# Altium footprint library Cyberdeck.PcbLib: 261 footprints (part 1 of 17)
Each footprint in its own frame and in the unit in brackets; x right, y up, seen from the top. Pads: shape width x height; smd on the part's side, far side on the other; paste and mask are expansions set on the pad; w line width, h text height; cw(c..) or ccw(c..) is an arc to the next point about the centre after c.
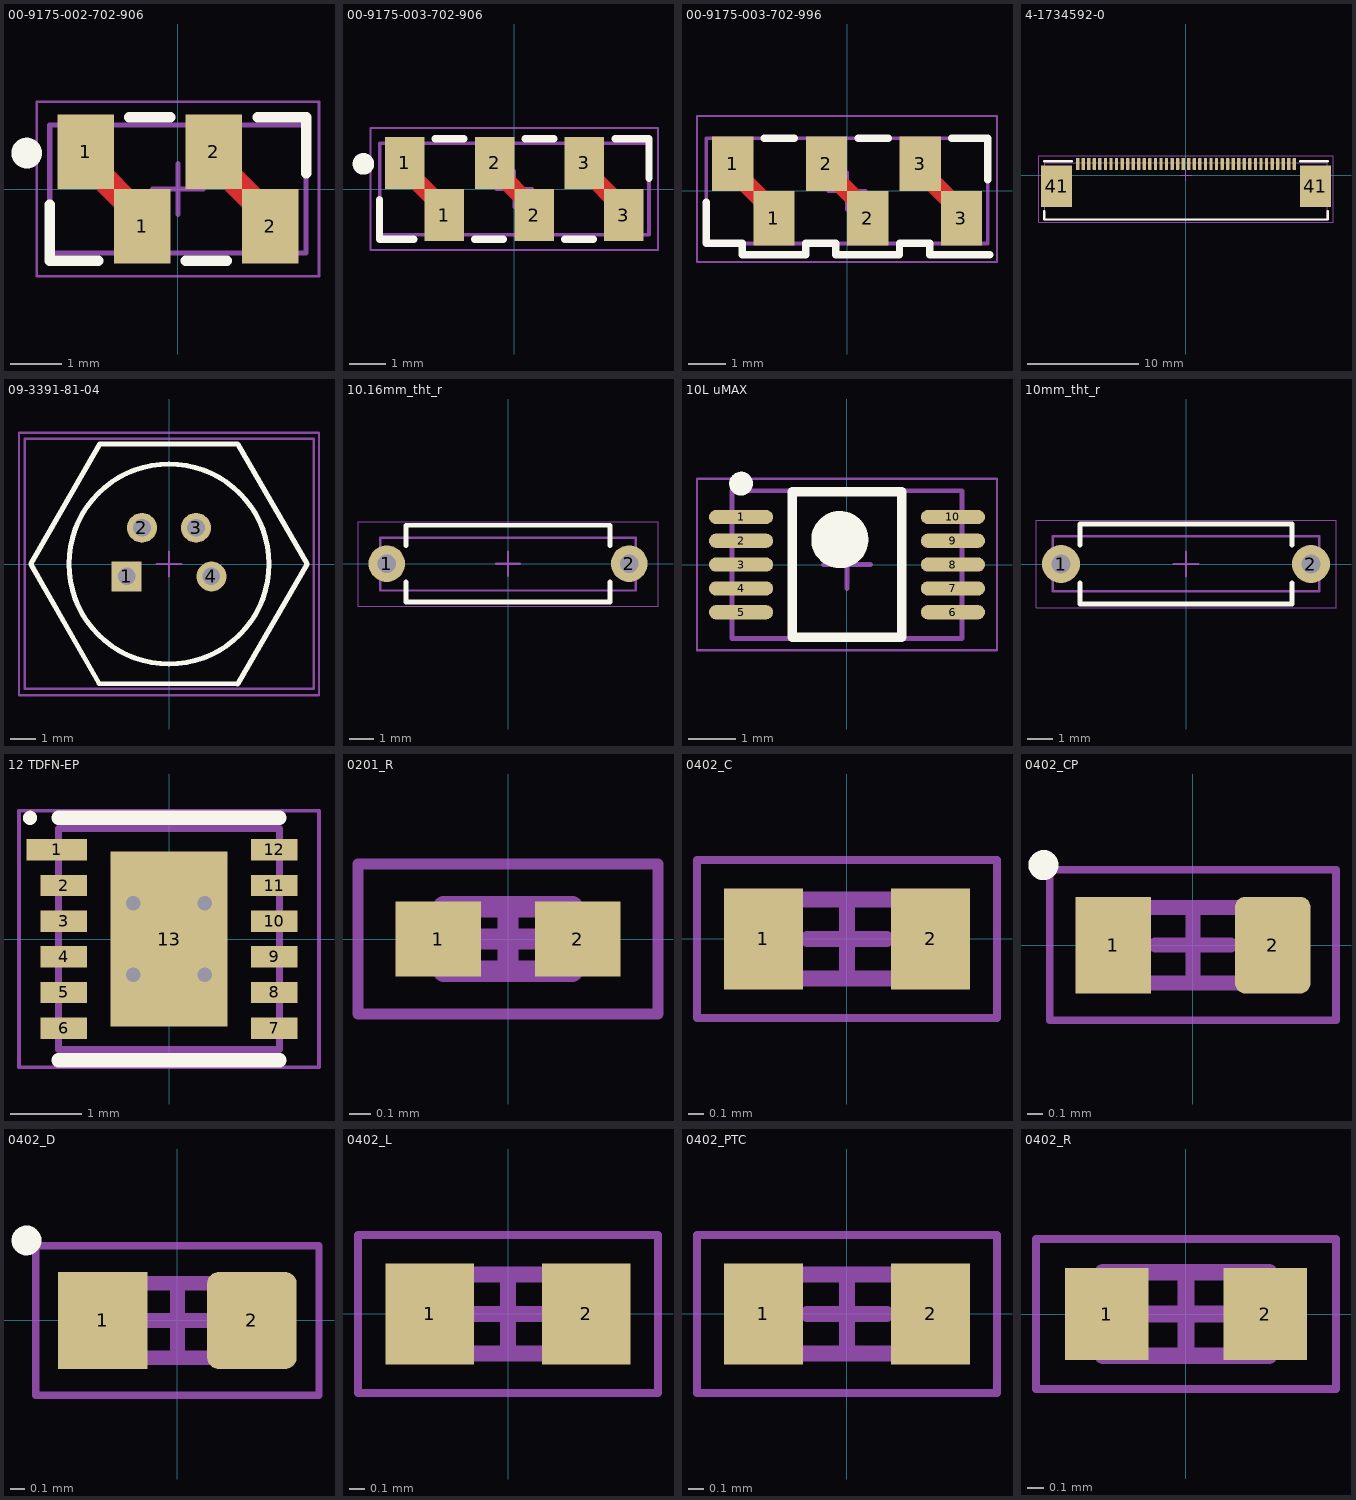
[diagram p0: the footprints below, top view; thin cyan lines are the x and y axes]

## 00-9175-002-702-906 [mm] "00-9175-002-702-906"
height 3.8
pads (4):
  rect 1.1x1.45 smd: 1(-1.8,0.725) 1(-0.7,-0.725) 2(0.7,0.725) 2(1.8,-0.725)
Top Layer:
  lines w0.5: -1.8,0.725 -1.8,0.55 -0.7,-0.55 -0.7,-0.725 ; 0.7,0.725 0.7,0.55 1.8,-0.55 1.8,-0.725
Top Overlay:
  circle w0.3: c-2.95,0.7 r0.15
  lines w0.2: -2.5,-0.3 -2.5,-1.4 -1.55,-1.4 ; -0.95,1.4 -0.15,1.4 ; 0.15,-1.4 0.95,-1.4 ; 1.55,1.4 2.5,1.4 2.5,0.3
Top Solder:
  lines w0.7: -1.887,0.638 -0.613,-0.637 ; 0.613,0.638 1.887,-0.637
Assembly Top:
  lines w0.1: -2.5,-1.25 -2.5,1.25 2.495,1.25 2.495,-1.25 -2.5,-1.25
Courtyard Top:
  lines w0.05: -2.75,-1.7 -2.75,1.7 2.75,1.7 2.75,-1.7 -2.75,-1.7
  lines w0.1: -0.5,0 0.5,0 ; 0,-0.5 0,0.5
3D body "AVX Interconnect-00-9175-002-702-906.STEP": height 3.71, standoff 0.01, extent -2.5,-1.25 2.5,1.25

## 00-9175-003-702-906 [mm] "00-9175-003-702-906"
height 3.8
pads (6):
  rect 1.1x1.45 smd paste-0.05: 1(-3.05,0.725) 1(-1.95,-0.725) 2(-0.55,0.725) 2(0.55,-0.725) 3(1.95,0.725) 3(3.05,-0.725)
Top Layer:
  lines w0.5: -3.137,0.637 -1.863,-0.637 ; -0.637,0.637 0.637,-0.637 ; 1.863,0.637 3.137,-0.637
Top Overlay:
  circle w0.3: c-4.2,0.7 r0.15
  lines w0.2: -3.75,-0.3 -3.75,-1.4 -2.8,-1.4 ; -2.2,1.4 -1.4,1.4 ; -1.1,-1.4 -0.3,-1.4 ; 0.3,1.4 1.1,1.4 ; 1.4,-1.4 2.2,-1.4 ; 2.8,1.4 3.75,1.4 3.75,0.3
Top Solder:
  lines w0.7: -3.137,0.637 -1.863,-0.637 ; -0.637,0.637 0.637,-0.637 ; 1.863,0.637 3.137,-0.637
Assembly Top:
  lines w0.1: -3.75,-1.275 3.75,-1.275 3.75,1.275 -3.75,1.275 -3.75,-1.275
Courtyard Top:
  lines w0.05: -4,-1.7 -4,1.7 4,1.7 4,-1.7 -4,-1.7
  lines w0.1: -0.5,0 0.5,0 ; 0,-0.5 0,0.5
3D body "AVX Interconnect-00-9175-003-702-906.STEP": height 3.71, standoff 0.01, extent -3.75,-1.25 3.75,1.25

## 00-9175-003-702-996 [mm] "00-9175-003-702-996"
height 5.2
pads (6):
  rect 1.1x1.45 smd: 1(-3.05,0.725) 1(-1.95,-0.725) 2(-0.55,0.725) 2(0.55,-0.725) 3(1.95,0.725) 3(3.05,-0.725)
Top Layer:
  lines w0.5: -2.7,0.2 -2.3,-0.2 ; -0.2,0.2 0.2,-0.2 ; 2.3,0.2 2.7,-0.2
Top Overlay:
  lines w0.2: -3.75,-0.3 -3.75,-1.4 -2.8,-1.4 -2.8,-1.7 -1.1,-1.7 -1.1,-1.4 -0.3,-1.4 -0.3,-1.7 1.4,-1.7 1.4,-1.4 2.2,-1.4 2.2,-1.7 3.8,-1.7 ; -2.2,1.4 -1.4,1.4 ; 0.3,1.4 1.1,1.4 ; 2.8,1.4 3.75,1.4 3.75,0.3
Top Solder:
  lines w0.7: -3.137,0.637 -1.863,-0.637 ; -0.637,0.637 0.637,-0.637 ; 1.863,0.637 3.137,-0.637
Assembly Top:
  lines w0.1: -3.75,1.4 -3.75,1.4 ; -3.75,1.4 -3.75,-1.4 3.75,-1.4 3.75,1.4 -3.75,1.4
Courtyard Top:
  lines w0.05: -4,-1.9 4,-1.9 4,2 -4,2 -4,-1.9
  lines w0.1: -0.5,0 0.5,0 ; 0,-0.5 0,0.5
3D body "AVX Interconnect-00-9175-003-702-996.STEP": height 3.71, standoff 0.01, extent -3.75,-1.4 3.75,1.4

## 4-1734592-0 [mm] "4-1734592-0"
height 2.1
pads (42):
  rect 0.3x1.1 smd mask+0.051: 1(-9.75,1)
  rrect50% 0.3x1.1 smd mask+0.051: 2(-9.25,1) 3(-8.75,1) 4(-8.25,1) 5(-7.75,1) 6(-7.25,1) 7(-6.75,1) 8(-6.25,1) 9(-5.75,1) 10(-5.25,1) 11(-4.75,1) 12(-4.25,1) 13(-3.75,1) 14(-3.25,1) 15(-2.75,1) 16(-2.25,1) 17(-1.75,1) 18(-1.25,1) 19(-0.75,1) 20(-0.25,1) 21(0.25,1) 22(0.75,1) 23(1.25,1) 24(1.75,1) 25(2.25,1) 26(2.75,1) 27(3.25,1) 28(3.75,1) 29(4.25,1) 30(4.75,1) 31(5.25,1) 32(5.75,1) 33(6.25,1) 34(6.75,1) 35(7.25,1) 36(7.75,1) 37(8.25,1) 38(8.75,1) 39(9.25,1) 40(9.75,1)
  rect 2.8x3.7 smd mask+0.051: 41(-11.65,-1) 41(11.65,-1)
Top Overlay:
  lines w0.2: -12.75,-3.25 -12.75,-4 12.75,-4 12.75,-3.25 ; -12.75,1.25 -10.25,1.25 ; 10.25,1.25 12.75,1.25
Assembly Top:
  lines w0.1: -12.715,-4.01 -12.715,1.1 12.715,1.1 12.715,-4.01 -12.715,-4.01
Courtyard Top:
  lines w0.05: -13.25,-4.25 -13.25,1.75 13.25,1.75 13.25,-4.25 -13.25,-4.25
  lines w0.1: -0.5,0 0.5,0 ; 0,-0.5 0,0.5
3D body "c-4-1734592-0-c-3d.stp": height 2.06, standoff 0.01, extent -12.715,-4.01 12.715,1.1

## 09-3391-81-04 [mm]
height 16
pads (4):
  rect 1.2x1.2 hole 0.7: 1(-1.7,-0.5)
  round 1.2 hole 0.7: 2(-1.08,1.45) 3(1.08,1.45) 4(1.7,-0.5)
Top Overlay:
  circle w0.2: c0,0 r4
  lines w0.2: -5.525,0 -2.8,-4.775 2.75,-4.8 5.525,0 2.75,4.8 -2.775,4.8 -5.525,0
Assembly Top:
  lines w0.1: -5.776,-5 -5.776,5 5.781,5 5.781,-5 -5.776,-5
Courtyard Top:
  lines w0.1: -0.5,0 0.5,0 ; 0,-0.5 0,0.5 ; -6,-5.25 6,-5.25 6,-0.5 6,5.25 -6,5.25 -6,-0.5 -6,-5.25
3D body "09_3391_81_04.stp": height 16.52, standoff -4.49, extent -5.776,-5 5.781,5

## 10.16mm_tht_r [mil]
height 137.8
pads (2):
  round 60 hole 29.92: 1(-198.82,0)
  round 60 hole 30: 2(198.82,0)
Top Overlay:
  lines w7.87: -167.32,-29.53 -167.32,-62.99 167.32,-62.99 167.32,-29.53 ; -167.32,29.53 -167.32,62.99 167.32,62.99 167.32,29.53
Assembly Top:
  lines w3.94: -209.83,-44.03 -209.83,42.31 209.82,42.31 209.82,-44.03 -209.83,-44.03
Courtyard Top:
  lines w1.97: -246.06,-70 -246.06,0 -246.06,68.9 246.06,68.9 246.06,-70 -246.06,-70
  lines w3.94: -19.68,0 19.68,0 ; 0,-19.68 0,19.68
3D body "Widerstand.stp": height 102.28, standoff -118.11, extent -209.82,-44.03 209.82,42.31

## 10L uMAX [mm] "10L uMAX Maxim,"
height 1.1
pads (10):
  oval 1.35x0.3 smd: 1(-2.225,1) 2(-2.225,0.5) 3(-2.225,0) 4(-2.225,-0.5) 5(-2.225,-1) 6(2.225,-1) 7(2.225,-0.5) 8(2.225,0) 9(2.225,0.5) 10(2.225,1)
Top Overlay:
  circle w0.6: c-0.15,0.525 r0.3
  circle w0.25: c-2.225,1.7 r0.125
  lines w0.2: -1.15,-1.525 1.15,-1.525 1.15,1.525 -1.15,1.525 -1.15,-1.525
Assembly Top:
  lines w0.1: -2.413,-1.55 2.413,-1.55 2.413,1.55 -2.413,1.55 -2.413,-1.55
Courtyard Top:
  lines w0.05: -3.15,-1.8 3.15,-1.8 3.15,1.8 -3.15,1.8 -3.15,-1.8
  lines w0.1: -0.5,0 0.5,0 ; 0,-0.5 0,0.5
3D body "10L uMAX.step": height 1.1, standoff 0, extent -2.45,-1.55 2.45,1.55

## 10mm_tht_r [mil]
height 137.8
pads (2):
  round 60 hole 29.92: 1(-196.85,0)
  round 60 hole 30: 2(196.85,0)
Top Overlay:
  lines w7.87: -167.32,-29.53 -167.32,-62.99 167.32,-62.99 167.32,-29.53 ; -167.32,29.53 -167.32,62.99 167.32,62.99 167.32,29.53
Assembly Top:
  lines w3.94: -209.83,-43.03 -209.83,43.31 209.82,43.31 209.82,-43.03 -209.83,-43.03
Courtyard Top:
  lines w1.97: -236.22,-68.9 -236.22,0 -236.22,68.9 236.22,68.9 236.22,-68.9 -236.22,-68.9
  lines w3.94: -19.68,0 19.68,0 ; 0,-19.68 0,19.68
3D body "Widerstand.stp": height 102.28, standoff -118.11, extent -209.82,-43.04 209.82,43.31

## 12 TDFN-EP [mm] "12 TDFN-EP TD1233-1, IPC Medium Density"
height 0.8
pads (13):
  rect 0.85x0.3 smd: 1(-1.575,1.25)
  rect 0.65x0.3 smd: 2(-1.475,0.75) 3(-1.475,0.25) 4(-1.475,-0.25) 5(-1.475,-0.75) 6(-1.475,-1.25) 7(1.475,-1.25) 8(1.475,-0.75) 9(1.475,-0.25) 10(1.475,0.25) 11(1.475,0.75) 12(1.475,1.25)
  rect 1.64x2.45 smd: 13(0,0)
via 0.5,-0.5 diameter 0.5 hole 0.2
via -0.5,-0.5 diameter 0.5 hole 0.2
via 0.5,0.5 diameter 0.5 hole 0.2
via -0.5,0.5 diameter 0.5 hole 0.2
Top Overlay:
  circle w0.1: c-1.95,1.7 r0.05
  lines w0.2: -1.55,-1.7 1.55,-1.7 ; -1.55,1.7 1.55,1.7
Assembly Top:
  lines w0.1: -1.55,-1.55 1.55,-1.55 1.55,1.55 -1.55,1.55 -1.55,-1.55
Courtyard Top:
  lines w0.05: -2.105,-1.8 2.105,-1.8 2.105,1.8 -2.105,1.8 -2.105,-1.8
  lines w0.1: -0.5,0 0.5,0 ; 0,-0.5 0,0.5
3D body "12 TDFN-EP.step": height 0.8, standoff 0, extent -1.55,-1.55 1.55,1.55

## 0201_R [mm] "Chip Resistor, 2-Leads, Body 0.60x0.30mm, IPC Medium Density"
height 0.25
pads (2):
  rect 0.4x0.35 smd: 1(-0.325,0) 2(0.325,0)
Assembly Top:
  lines w0.1: -0.3,-0.15 -0.3,0.15 0.3,0.15 0.3,-0.15 -0.3,-0.15
Courtyard Top:
  lines w0.05: -0.7,-0.35 -0.7,0.35 0.7,0.35 0.7,-0.35 -0.7,-0.35
  lines w0.1: -0.15,0 0.15,0 ; 0,-0.15 0,0.15
3D body "R_0201.step": height 0.25, standoff 0, extent -0.3,-0.15 0.3,0.15

## 0402_C [mm] "0402_C"
height 0.5
pads (2):
  rect 0.5x0.64 smd: 1(-0.53,0) 2(0.53,0)
Assembly Top:
  lines w0.1: -0.5,-0.25 0.5,-0.25 0.5,0.25 -0.5,0.25 -0.5,-0.25
Courtyard Top:
  lines w0.05: -0.95,-0.5 0.95,-0.5 0.95,0.5 -0.95,0.5 -0.95,-0.5
  lines w0.1: -0.25,0 0.25,0 ; 0,-0.25 0,0.25
3D body "CAPC-0402-T0.55-BN.stp": height 0.55, standoff 0, extent -0.525,-0.275 0.525,0.275

## 0402_CP [mm] "0402_CP"
height 0.5
pads (2):
  rect 0.5x0.64 smd: 1(-0.53,0)
  rrect25% 0.5x0.64 smd: 2(0.53,0)
Top Overlay:
  circle w0.1: c-0.992,0.532 r0.05
Assembly Top:
  lines w0.1: -0.5,-0.25 -0.5,0.25 0.5,0.25 0.5,-0.25 -0.5,-0.25
Courtyard Top:
  lines w0.05: -0.95,-0.5 -0.95,0.5 0.95,0.5 0.95,-0.5 -0.95,-0.5
  lines w0.1: -0.25,0 0.25,0 ; 0,-0.25 0,0.25
3D body "CAPC-0402-T0.55-BN.stp": height 0.55, standoff 0, extent -0.525,-0.275 0.525,0.275

## 0402_D [mm] "0402_D"
height 0.35
pads (2):
  rect 0.6x0.65 smd: 1(-0.5,0)
  rrect25% 0.6x0.65 smd: 2(0.5,0)
Top Overlay:
  circle w0.1: c-1.012,0.537 r0.05
Assembly Top:
  lines w0.1: -0.5,-0.25 0.5,-0.25 0.5,0.25 -0.5,0.25 -0.5,-0.25
Courtyard Top:
  lines w0.05: -0.95,-0.5 0.95,-0.5 0.95,0.5 -0.95,0.5 -0.95,-0.5
  lines w0.1: -0.25,0 0.25,0 ; 0,-0.25 0,0.25
3D body: height 0.35, standoff 0, extent -0.5,-0.25 -0.27,0.25
3D body: height 0.35, standoff 0, extent -0.27,-0.25 0.27,0.25
3D body: height 0.35, standoff 0, extent 0.27,-0.25 0.5,0.25

## 0402_L [mm] "0402_L"
height 0.35
pads (2):
  rect 0.56x0.64 smd: 1(-0.495,0) 2(0.495,0)
Assembly Top:
  lines w0.1: -0.5,-0.25 -0.5,0.25 0.5,0.25 0.5,-0.25 -0.5,-0.25
Courtyard Top:
  lines w0.05: -0.95,-0.5 -0.95,0.5 0.95,0.5 0.95,-0.5 -0.95,-0.5
  lines w0.1: -0.25,0 0.25,0 ; 0,-0.25 0,0.25
3D body: height 0.35, standoff 0, extent 0.27,-0.25 0.5,0.25
3D body: height 0.35, standoff 0, extent -0.27,-0.25 0.27,0.25
3D body: height 0.35, standoff 0, extent -0.5,-0.25 -0.27,0.25

## 0402_PTC [mm] "0402_PTC"
height 0.4
pads (2):
  rect 0.5x0.64 smd: 1(-0.53,0) 2(0.53,0)
Assembly Top:
  lines w0.1: -0.5,-0.25 -0.5,0.25 0.5,0.25 0.5,-0.25 -0.5,-0.25
Courtyard Top:
  lines w0.05: -0.95,-0.5 0.95,-0.5 0.95,0.5 -0.95,0.5 -0.95,-0.5
  lines w0.1: -0.25,0 0.25,0 ; 0,-0.25 0,0.25
3D body: height 0.4, standoff 0, extent -0.5,-0.25 -0.35,0.25
3D body: height 0.4, standoff 0, extent -0.35,-0.25 0.35,0.25
3D body: height 0.4, standoff 0, extent 0.35,-0.25 0.5,0.25

## 0402_R [mm] "0402_R"
height 0.35
pads (2):
  rect 0.5x0.55 smd: 1(-0.475,0) 2(0.475,0)
Assembly Top:
  lines w0.1: -0.5,-0.25 -0.5,0.25 0.5,0.25 0.5,-0.25 -0.5,-0.25
Courtyard Top:
  lines w0.05: -0.9,-0.45 0.9,-0.45 0.9,0.45 -0.9,0.45 -0.9,-0.45
  lines w0.1: -0.25,0 0.25,0 ; 0,-0.25 0,0.25
3D body "RESC-0402.stp": height 0.4, standoff 0, extent -0.525,-0.275 0.525,0.275